# Altium footprint library AD_Lib.PcbLib: 508 footprints (part 9 of 32)
Each footprint in its own frame and in the unit in brackets; x right, y up, seen from the top. Pads: shape width x height; smd on the part's side, far side on the other; paste and mask are expansions set on the pad; w line width, h text height; cw(c..) or ccw(c..) is an arc to the next point about the centre after c.
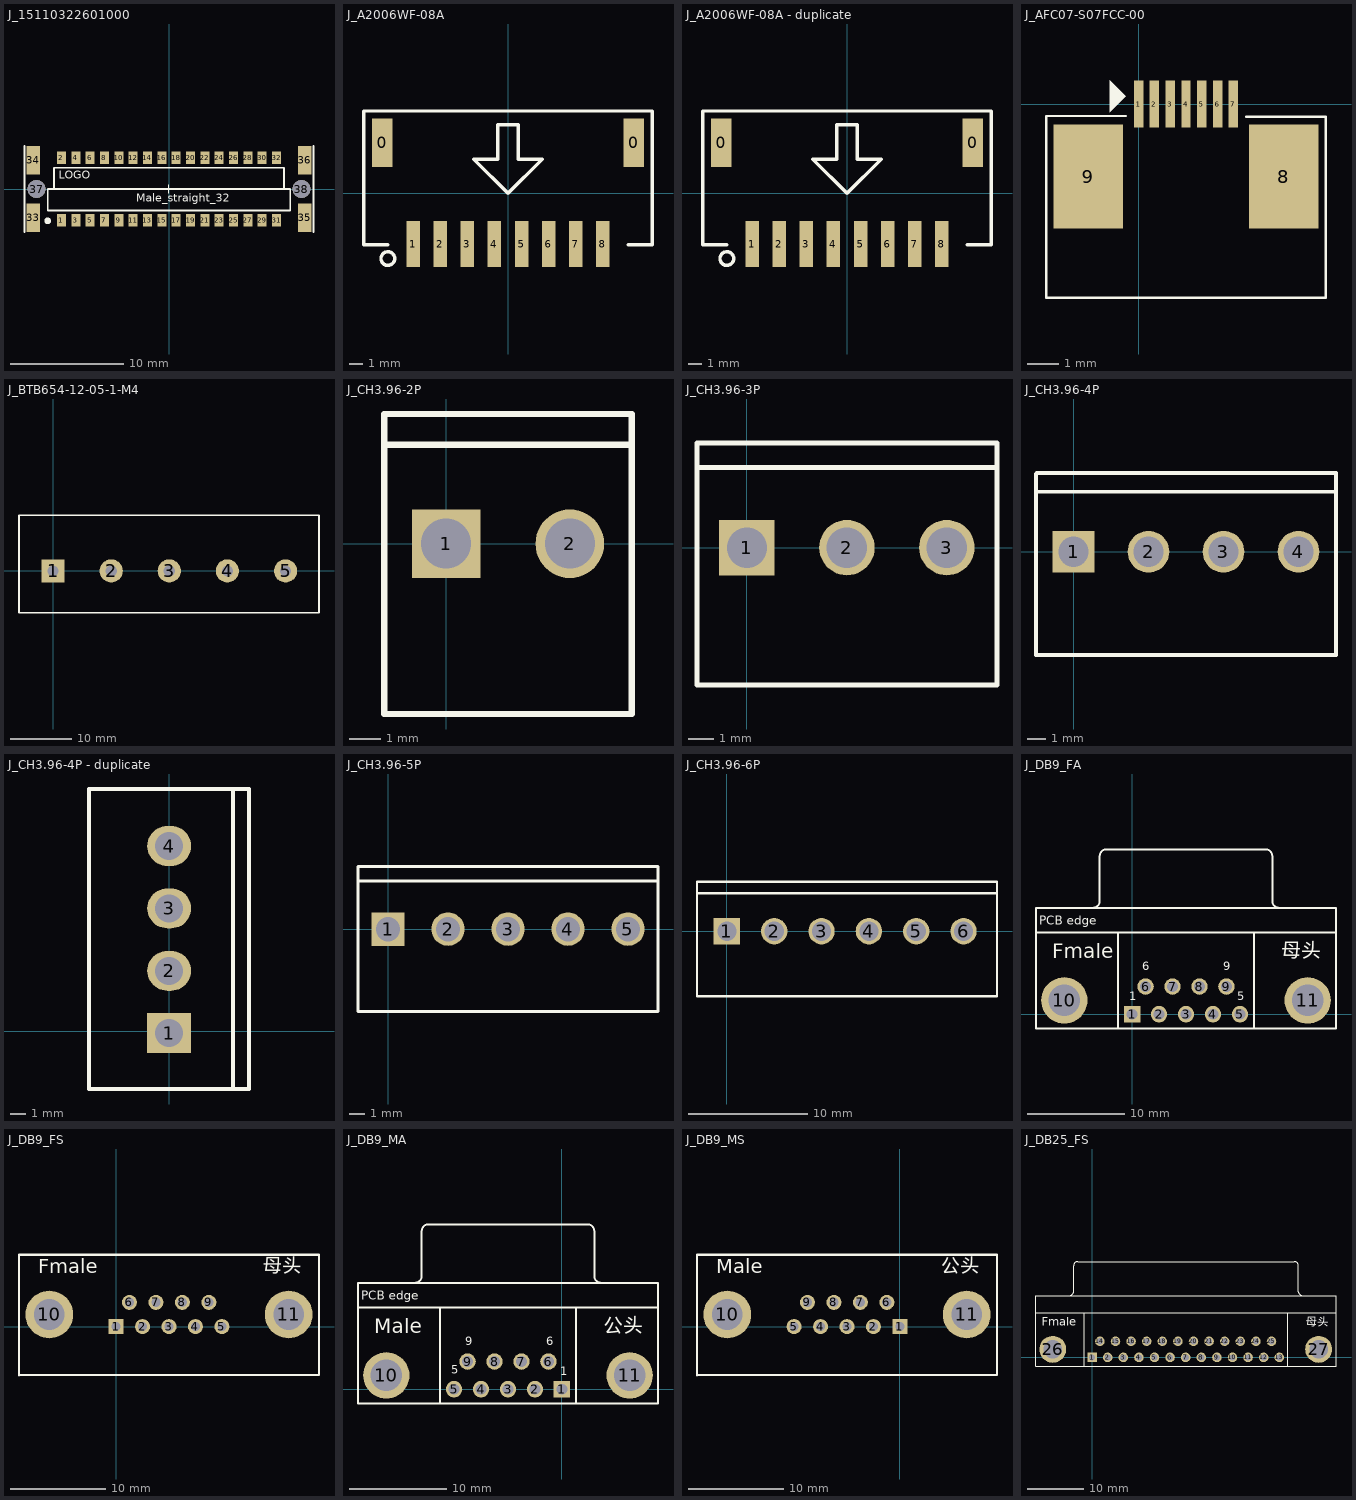
[diagram p8: the footprints below, top view; thin cyan lines are the x and y axes]

## J_15110322601000 [mm] "Male"
height 1.75
pads (38):
  rect 0.8x1.1 smd mask+0.051: 1(-9.525,-2.75) 2(-9.525,2.75) 3(-8.255,-2.75) 4(-8.255,2.75) 5(-6.985,-2.75) 6(-6.985,2.75) 7(-5.715,-2.75) 8(-5.715,2.75) 9(-4.445,-2.75) 10(-4.445,2.75) 11(-3.175,-2.75) 12(-3.175,2.75) 13(-1.905,-2.75) 14(-1.905,2.75) 15(-0.635,-2.75) 16(-0.635,2.75) 17(0.635,-2.75) 18(0.635,2.75) 19(1.905,-2.75) 20(1.905,2.75) 21(3.175,-2.75) 22(3.175,2.75) 23(4.445,-2.75) 24(4.445,2.75) 25(5.715,-2.75) 26(5.715,2.75) 27(6.985,-2.75) 28(6.985,2.75) 29(8.255,-2.75) 30(8.255,2.75) 31(9.525,-2.75) 32(9.525,2.75)
  rect 1.2x2.5 smd mask+0.051: 33(-12.035,-2.55) 34(-12.035,2.55) 35(12.035,-2.55) 36(12.035,2.55)
  round 1.6 hole 1.6 unplated mask+0.102: 37(-11.735,0) 38(11.735,0)
Top Overlay:
  circle w0.3: c-10.747,-2.819 r0.15
  lines w0.102: 0,-0.381 0,0.381
  lines w0.152: -12.802,-3.81 -12.802,3.81 ; -10.185,0.025 -10.185,1.88 ; -10.16,1.88 10.185,1.88 10.185,0 ; 12.802,-3.81 12.802,3.81 ; -10.744,-1.905 -10.744,0 10.744,0 10.744,-1.905 -10.744,-1.905
  text "LOGO" at -9.779,0.635 h1.2
  text "Male_straight_32" at -2.921,-1.397 h1.2

## J_A2006WF-08A [mm] "贴片插座，8Pin，间距2.0mm"
height 5.5
pads (10):
  rect 1.5x3.6 smd: 0(-9.3,3.75) 0(9.3,3.75)
  rect 1x3.4 smd: 1(-7,-3.75) 2(-5,-3.75) 3(-3,-3.75) 4(-1,-3.75) 5(1,-3.75) 6(3,-3.75) 7(5,-3.75) 8(7,-3.75)
Top Overlay:
  circle w0.254: c-8.89,-4.826 r0.508
  lines w0.254: -8.89,-3.81 -10.668,-3.81 -10.668,6.096 10.668,6.096 10.668,-3.81 8.89,-3.81 ; -2.54,2.54 0,0 2.54,2.54 0.762,2.54 0.762,5.08 -0.762,5.08 -0.762,2.54 -2.54,2.54

## J_A2006WF-08A - duplicate [mm] "贴片插座，8Pin，间距2.0mm"
height 5.5
pads (10):
  rect 1.5x3.6 smd: 0(-9.3,3.75) 0(9.3,3.75)
  rect 1x3.4 smd: 1(-7,-3.75) 2(-5,-3.75) 3(-3,-3.75) 4(-1,-3.75) 5(1,-3.75) 6(3,-3.75) 7(5,-3.75) 8(7,-3.75)
Top Overlay:
  circle w0.254: c-8.89,-4.826 r0.508
  lines w0.254: -8.89,-3.81 -10.668,-3.81 -10.668,6.096 10.668,6.096 10.668,-3.81 8.89,-3.81 ; -2.54,2.54 -0.762,2.54 -0.762,5.08 0.762,5.08 0.762,2.54 2.54,2.54 0,0 -2.54,2.54

## J_AFC07-S07FCC-00 [mil] "JTAG编程口"
height 57.09
pads (9):
  rect 11.9x59.1 smd: 1(0,0)
  rect 11.8x59.1 smd: 2(19.65,0) 3(39.35,0) 4(59.05,0) 5(78.75,0) 6(98.45,0) 7(118.15,0)
  rect 86.6x130 smd: 8(181.09,-90.45) 9(-62.99,-90.45)
Top Overlay:
  region: -15.95,9.78 -35.95,29.77 -35.95,-10.22
  lines w3: -15.95,-15 -115,-15 -115,-165 -115,-241.75 233.1,-241.75 233.1,-15.7 134.05,-15.7

## J_BTB654-12-05-1-M4 [mil] "栅栏式接线端子，BTB654系列"
pads (5):
  rect 150x150 hole 73: 1(0,0)
  round 150 hole 73: 2(375,0) 3(750,0) 4(1125,0) 5(1500,0)
Top Overlay:
  lines w10: -220,-270 1716,-270 1716,360 -220,360 -220,-270

## J_CH3.96-2P [mm] "CH3.96"
height 17
pads (2):
  rect 2.2x2.2 hole 1.6 square: 1(0,0)
  round 2.2 hole 1.6: 2(3.96,0)
Top Overlay:
  lines w0.2: -1.98,3.167 5.94,3.167 ; -1.98,-5.45 -1.98,4.15 5.94,4.15 5.94,-5.45 -1.98,-5.45

## J_CH3.96-3P [mm] "CH3.96"
height 17
pads (3):
  rect 2.2x2.2 hole 1.6 square: 1(0,0)
  round 2.2 hole 1.6: 2(3.96,0) 3(7.92,0)
Top Overlay:
  lines w0.2: -1.98,3.167 9.906,3.167 ; 9.9,-5.45 9.9,4.15 ; 9.906,-5.45 -1.98,-5.45 -1.98,4.15 9.906,4.15

## J_CH3.96-4P [mm] "CH3.96"
height 17
pads (4):
  rect 2.2x2.2 hole 1.6 square: 1(0,0)
  round 2.2 hole 1.6: 2(3.96,0) 3(7.92,0) 4(11.88,0)
Top Overlay:
  lines w0.2: -1.905,3.167 13.843,3.175 ; 13.843,4.15 -1.946,4.15 -1.98,4.116 -1.98,-5.45 13.86,-5.45 13.86,4.15

## J_CH3.96-4P - duplicate [mil] "CH3.96胶壳接线端子"
pads (4):
  rect 110x100 hole 70: 1(0.5,-5.5)
  oval 110x100 hole 70: 2(0.5,150.5) 3(0.5,306.5) 4(0.5,462.5)
Top Layer:
  lines w50: 0.5,-5.5 1,-5
Top Overlay:
  lines w10: 160,-145 160,605 ; -200,-145 -200,605 200,605 200,-145 -200,-145

## J_CH3.96-5P [mm] "CH3.96"
height 17
pads (5):
  rect 2.2x2.2 hole 1.6 square: 1(0,0)
  round 2.2 hole 1.6: 2(3.96,0) 3(7.92,0) 4(11.88,0) 5(15.84,0)
Top Overlay:
  lines w0.2: -1.98,3.167 17.82,3.167 ; -1.98,-5.45 -1.98,4.15 17.82,4.15 17.82,-5.45 -1.98,-5.45

## J_CH3.96-6P [mm] "CH3.96"
height 17
pads (6):
  rect 2.2x2.2 hole 1.6 square: 1(0,0)
  round 2.2 hole 1.6: 2(3.96,0) 3(7.92,0) 4(11.88,0) 5(15.84,0) 6(19.8,0)
Top Overlay:
  lines w0.2: -2.5,3.167 22.596,3.167 ; -2.5,-5.45 22.596,-5.45 22.596,4.15 -2.5,4.15 -2.5,-5.45

## J_DB9_FA [mm] "Connector; D Subminiature; 9 Position; Right Angle; Pitch 1.385 mm"
height 12.75
pads (11):
  rect 1.69x1.69 hole 1.09: 1(0,0)
  round 1.69 hole 1.09: 2(2.77,0) 3(5.54,0) 4(8.31,0) 5(11.08,0) 6(1.385,2.84) 7(4.155,2.84) 8(6.925,2.84) 9(9.695,2.84)
  round 4.76 hole 3.26: 10(-6.955,1.42) 11(18.035,1.42)
Top Overlay:
  lines w0.178: -9.788,8.38 20.94,8.38
  lines w0.2: -4.02,10.925 ccw(c-4.02,11.62) -3.325,11.62 -3.325,16.22 ; -3.32,16.225 cw(c-2.625,16.225) -2.625,16.92 13.705,16.92 cw(c13.705,16.225) 14.4,16.225 ; -1.46,-1.48 -1.46,8.38 ; 12.54,-1.48 12.54,8.38 ; 14.405,16.22 14.405,11.62 ccw(c15.1,11.62) 15.1,10.925 ; -9.86,-1.48 -9.86,10.92 20.94,10.92 20.94,-1.48 -9.86,-1.48
  text "PCB edge" at -9.525,8.89 h1.52
  text "Fmale" at -8.176,5.205 h2.54
  text "母头" at 15.319,5.332 h2.54
  text "1" at -0.279,1.143 h1.5
  text "5" at 10.801,1.143 h1.5
  text "9" at 9.373,4.216 h1.5
  text "6" at 1.063,4.216 h1.5
Bottom Overlay:
  text "9" at 9.858,4.189 h1.5
  text "6" at 1.603,4.189 h1.5
  text "5" at 11.255,1.141 h1.5
  text "Fmale" at -3.429,5.207 h2.54
  text "母头" at 19.558,5.334 h2.54
  text "1" at 0.206,1.141 h1.5

## J_DB9_FS [mil] "Dsub9，母头，直针"
height 59.06
pads (11):
  rect 62x62 hole 38: 1(0,0)
  round 62 hole 38: 2(109,0) 3(218,0) 4(327,0) 5(436,0) 6(55,100) 7(164,100) 8(273,100) 9(382,100)
  round 196.85 hole 125.98: 10(-275,50) 11(711,50)
Top Overlay:
  lines w8: -400,-200 836,-200 836,296.06
  lines w10: -400,-200 -400,296.06 836,296.06
  text "母头" at 604.07,204.02 h100
  text "Fmale" at -320.93,199.02 h100
Bottom Overlay:
  text "5" at 444.07,39.02 h59.06
  text "1" at 9.07,39.02 h59.06
  text "6" at 64.07,159.02 h59.06
  text "9" at 389.07,159.02 h59.06

## J_DB9_MA [mm] "Connector; D Subminiature; 9 Position; Right Angle; Pitch 1.385 mm"
height 12.75
pads (11):
  rect 1.69x1.69 hole 1.09: 1(0,0)
  round 1.69 hole 1.09: 2(-2.77,0) 3(-5.54,0) 4(-8.31,0) 5(-11.08,0) 6(-1.385,2.84) 7(-4.155,2.84) 8(-6.925,2.84) 9(-9.695,2.84)
  round 4.76 hole 3.26: 10(-18.035,1.42) 11(6.955,1.42)
Top Overlay:
  lines w0.178: -20.868,8.38 9.86,8.38
  lines w0.2: -15.1,10.925 ccw(c-15.1,11.62) -14.405,11.62 -14.405,16.22 ; -14.4,16.225 cw(c-13.705,16.225) -13.705,16.92 2.625,16.92 cw(c2.625,16.225) 3.32,16.225 ; -12.54,-1.48 -12.54,8.38 ; 1.46,-1.48 1.46,8.38 ; 3.325,16.22 3.325,11.62 ccw(c4.02,11.62) 4.02,10.925 ; -20.94,-1.48 9.86,-1.48 9.86,10.92 -20.94,10.92 -20.94,-1.48
  text "公头" at 4.239,5.332 h2.54
  text "PCB edge" at -20.605,8.89 h1.52
  text "5" at -11.379,1.27 h1.5
  text "1" at -0.178,1.143 h1.5
  text "6" at -1.626,4.191 h1.5
  text "9" at -9.936,4.191 h1.5
  text "Male" at -19.256,5.205 h2.54
Bottom Overlay:
  text "公头" at 8.509,5.334 h2.54
  text "9" at -9.477,4.189 h1.5
  text "6" at -1.095,4.189 h1.5
  text "1" at 0.302,1.141 h1.5
  text "5" at -10.874,1.268 h1.5
  text "Male" at -15.494,5.232 h2.54

## J_DB9_MS [mil] "Dsub9，公头，直针"
height 59.06
pads (11):
  rect 62x62 hole 38: 1(0,0)
  round 62 hole 38: 2(-109,0) 3(-218,0) 4(-327,0) 5(-436,0) 6(-54,100) 7(-163,100) 8(-272,100) 9(-381,100)
  round 196.85 hole 125.98: 10(-711,50) 11(275,50)
Top Overlay:
  lines w8: -836,-200 400,-200 400,296.06
  lines w10: -836,-200 -836,296.06 400,296.06
  text "公头" at 168.07,204.02 h100
  text "Male" at -756.93,199.02 h100
Bottom Overlay:
  text "9" at -371.93,159.02 h59.06
  text "6" at -41.93,159.02 h59.06
  text "1" at 13.07,39.02 h59.06
  text "5" at -426.93,44.02 h59.06

## J_DB25_FS [mm] "Dsub25，母头，直针，Pitch = 2.76mm"
height 12.93
pads (27):
  rect 1.69x1.69 hole 1.09: 1(0,0)
  round 1.69 hole 1.09: 2(2.761,0) 3(5.522,0) 4(8.283,0) 5(11.044,0) 6(13.805,0) 7(16.566,0) 8(19.327,0) 9(22.088,0) 10(24.849,0) 11(27.61,0) 12(30.371,0) 13(33.132,0) 14(1.381,2.84) 15(4.142,2.84) 16(6.903,2.84) 17(9.664,2.84) 18(12.424,2.84) 19(15.185,2.84) 20(17.946,2.84) 21(20.707,2.84) 22(23.469,2.84) 23(26.23,2.84) 24(28.991,2.84) 25(31.752,2.84)
  round 4.76 hole 3.26: 26(-6.96,1.42) 27(40.092,1.42)
Top Overlay:
  lines w0.2: -9.93,7.92 43.17,7.92 ; -3.975,10.925 ccw(c-3.975,11.62) -3.28,11.62 -3.28,16.22 ; -3.275,16.225 cw(c-2.58,16.225) -2.58,16.92 35.82,16.92 cw(c35.82,16.225) 36.515,16.225 ; -1.38,-1.58 -1.38,7.92 ; 34.62,-1.58 34.62,7.92 ; 36.52,16.22 36.52,11.62 ccw(c37.215,11.62) 37.215,10.925 ; -9.93,-1.58 43.17,-1.58 43.17,10.92 -9.93,10.92 -9.93,-1.58
  text "母头" at 37.846,5.08 h2.54
  text "Fmale" at -8.89,5.08 h2.54
Bottom Overlay:
  text "14" at 2.032,4.064 h1.5
  text "15" at 4.793,4.064 h1.5
  text "25" at 32.403,4.064 h1.5
  text "24" at 29.642,4.064 h1.5
  text "13" at 33.783,1.224 h1.5
  text "1" at 0.254,1.143 h1.5